# Altium integrated library Weidmueller_OMNIMATE_Power.IntLib: 508 symbols (part 5 of 9)
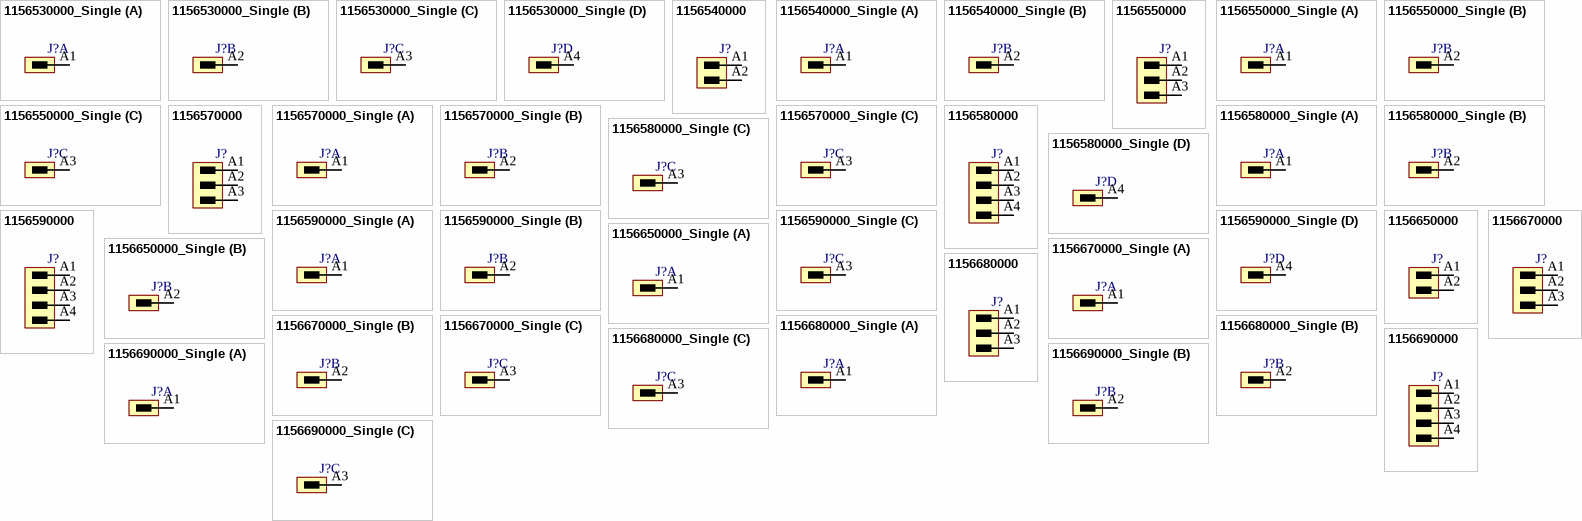
[diagram p35: symbols 1156530000_Single to 1156690000_Single]

## 1156650000_Single
designator J?
OMNIMATE Power - series BU/SU 10.16IT; PartNumber: 1156650000; Manufacturer: Weidmueller; Short_text_for_material: SU 10.16IT/02/90MF2 3.5AG BK BX SO; Side_termination_characteristic: closed side; Note: Middle flange; Mounting_onto_the_PCB: Solder connection; Pitch_mm: 10.16 mm; Pitch_inch: 0.4 inch; No_of_poles: 2; Outgoing_elbow: 90°; Solder_pin_length_mm: 3.5 mm; Contact_material: Cu-Leg; Contact_surface: silver-plated; Insulating_material: PA GF; UL_94_flammability_rating: V-0; Rated_voltage_for_surge_voltage_class_pollution_degree_II_2: 1000 V; Rated_voltage_use_group_B_UL_1059: 300 V; Rated_current_use_group_B_UL_1059: 54 A; PackageReference: SU_10_16IT_90MF2_02; Colour: Black; Packaging: Box; Qty: 60 PCS; Revision: V1; ComponentLink1Description: Manufacturer URL; ComponentLink1URL: http://www.weidmueller.com/; ComponentLink2Description: URL Link1; ComponentLink2URL: http://catalog.weidmueller.com/catalog/Start.do?localeId=en&ObjectID=1156650000
footprint SU_10_16IT_90MF2_02 (OMNIMATE Power - Serie BU/SU 10.16IT  SU 10.16IT/02/90MF2 3.5)
part A pins: A1
part B pins: A2

## 1156670000
designator J?
OMNIMATE Power - series BU/SU 10.16IT; PartNumber: 1156670000; Manufacturer: Weidmueller; Short_text_for_material: SU 10.16IT/03/90MF2 3.5AG BK BX; Side_termination_characteristic: closed side; Note: Middle flange; Mounting_onto_the_PCB: Solder connection; Pitch_mm: 10.16 mm; Pitch_inch: 0.4 inch; No_of_poles: 3; Outgoing_elbow: 90°; Solder_pin_length_mm: 3.5 mm; Contact_material: Cu-Leg; Contact_surface: silver-plated; Insulating_material: PA GF; UL_94_flammability_rating: V-0; Rated_voltage_for_surge_voltage_class_pollution_degree_II_2: 1000 V; Rated_voltage_use_group_B_UL_1059: 300 V; Rated_current_use_group_B_UL_1059: 54 A; PackageReference: SU_10_16IT_90MF2_03; Colour: Black; Packaging: Box; Qty: 42 PCS; Revision: V1; ComponentLink1Description: Manufacturer URL; ComponentLink1URL: http://www.weidmueller.com/; ComponentLink2Description: URL Link1; ComponentLink2URL: http://catalog.weidmueller.com/catalog/Start.do?localeId=en&ObjectID=1156670000
footprint SU_10_16IT_90MF2_03 (OMNIMATE Power - Serie BU/SU 10.16IT  SU 10.16IT/02/90MF3 3.5)
pins: A1, A2, A3

## 1156670000_Single
designator J?
OMNIMATE Power - series BU/SU 10.16IT; PartNumber: 1156670000; Manufacturer: Weidmueller; Short_text_for_material: SU 10.16IT/03/90MF2 3.5AG BK BX; Side_termination_characteristic: closed side; Note: Middle flange; Mounting_onto_the_PCB: Solder connection; Pitch_mm: 10.16 mm; Pitch_inch: 0.4 inch; No_of_poles: 3; Outgoing_elbow: 90°; Solder_pin_length_mm: 3.5 mm; Contact_material: Cu-Leg; Contact_surface: silver-plated; Insulating_material: PA GF; UL_94_flammability_rating: V-0; Rated_voltage_for_surge_voltage_class_pollution_degree_II_2: 1000 V; Rated_voltage_use_group_B_UL_1059: 300 V; Rated_current_use_group_B_UL_1059: 54 A; PackageReference: SU_10_16IT_90MF2_03; Colour: Black; Packaging: Box; Qty: 42 PCS; Revision: V1; ComponentLink1Description: Manufacturer URL; ComponentLink1URL: http://www.weidmueller.com/; ComponentLink2Description: URL Link1; ComponentLink2URL: http://catalog.weidmueller.com/catalog/Start.do?localeId=en&ObjectID=1156670000
footprint SU_10_16IT_90MF2_03 (OMNIMATE Power - Serie BU/SU 10.16IT  SU 10.16IT/02/90MF3 3.5)
part A pins: A1
part B pins: A2
part C pins: A3

## 1156680000
designator J?
OMNIMATE Power - series BU/SU 10.16IT; PartNumber: 1156680000; Manufacturer: Weidmueller; Short_text_for_material: SU 10.16IT/03/90MF3 3.5AG BK BX; Side_termination_characteristic: closed side; Note: Middle flange; Mounting_onto_the_PCB: Solder connection; Pitch_mm: 10.16 mm; Pitch_inch: 0.4 inch; No_of_poles: 3; Outgoing_elbow: 90°; Solder_pin_length_mm: 3.5 mm; Contact_material: Cu-Leg; Contact_surface: silver-plated; Insulating_material: PA GF; UL_94_flammability_rating: V-0; Rated_voltage_for_surge_voltage_class_pollution_degree_II_2: 1000 V; Rated_voltage_use_group_B_UL_1059: 300 V; Rated_current_use_group_B_UL_1059: 54 A; PackageReference: SU_10_16IT_90MF3_03; Colour: Black; Packaging: Box; Qty: 42 PCS; Revision: V1; ComponentLink1Description: Manufacturer URL; ComponentLink1URL: http://www.weidmueller.com/; ComponentLink2Description: URL Link1; ComponentLink2URL: http://catalog.weidmueller.com/catalog/Start.do?localeId=en&ObjectID=1156680000
footprint SU_10_16IT_90MF3_03 (OMNIMATE Power - Serie BU/SU 10.16IT  SU 10.16IT/04/90MF4 3.5)
pins: A1, A2, A3

## 1156680000_Single
designator J?
OMNIMATE Power - series BU/SU 10.16IT; PartNumber: 1156680000; Manufacturer: Weidmueller; Short_text_for_material: SU 10.16IT/03/90MF3 3.5AG BK BX; Side_termination_characteristic: closed side; Note: Middle flange; Mounting_onto_the_PCB: Solder connection; Pitch_mm: 10.16 mm; Pitch_inch: 0.4 inch; No_of_poles: 3; Outgoing_elbow: 90°; Solder_pin_length_mm: 3.5 mm; Contact_material: Cu-Leg; Contact_surface: silver-plated; Insulating_material: PA GF; UL_94_flammability_rating: V-0; Rated_voltage_for_surge_voltage_class_pollution_degree_II_2: 1000 V; Rated_voltage_use_group_B_UL_1059: 300 V; Rated_current_use_group_B_UL_1059: 54 A; PackageReference: SU_10_16IT_90MF3_03; Colour: Black; Packaging: Box; Qty: 42 PCS; Revision: V1; ComponentLink1Description: Manufacturer URL; ComponentLink1URL: http://www.weidmueller.com/; ComponentLink2Description: URL Link1; ComponentLink2URL: http://catalog.weidmueller.com/catalog/Start.do?localeId=en&ObjectID=1156680000
footprint SU_10_16IT_90MF3_03 (OMNIMATE Power - Serie BU/SU 10.16IT  SU 10.16IT/04/90MF4 3.5)
part A pins: A1
part B pins: A2
part C pins: A3

## 1156690000
designator J?
OMNIMATE Power - series BU/SU 10.16IT; PartNumber: 1156690000; Manufacturer: Weidmueller; Short_text_for_material: SU 10.16IT/04/90MF2 3.5AG BK BX; Side_termination_characteristic: closed side; Note: Middle flange; Mounting_onto_the_PCB: Solder connection; Pitch_mm: 10.16 mm; Pitch_inch: 0.4 inch; No_of_poles: 4; Outgoing_elbow: 90°; Solder_pin_length_mm: 3.5 mm; Contact_material: Cu-Leg; Contact_surface: silver-plated; Insulating_material: PA GF; UL_94_flammability_rating: V-0; Rated_voltage_for_surge_voltage_class_pollution_degree_II_2: 1000 V; Rated_voltage_use_group_B_UL_1059: 300 V; Rated_current_use_group_B_UL_1059: 54 A; PackageReference: SU_10_16IT_90MF2_04; Colour: Black; Packaging: Box; Qty: 36 PCS; Revision: V1; ComponentLink1Description: Manufacturer URL; ComponentLink1URL: http://www.weidmueller.com/; ComponentLink2Description: URL Link1; ComponentLink2URL: http://catalog.weidmueller.com/catalog/Start.do?localeId=en&ObjectID=1156690000
footprint SU_10_16IT_90MF2_04 (OMNIMATE Power - Serie BU/SU 10.16IT  SU 10.16IT/04/90MF4 3.5)
pins: A1, A2, A3, A4

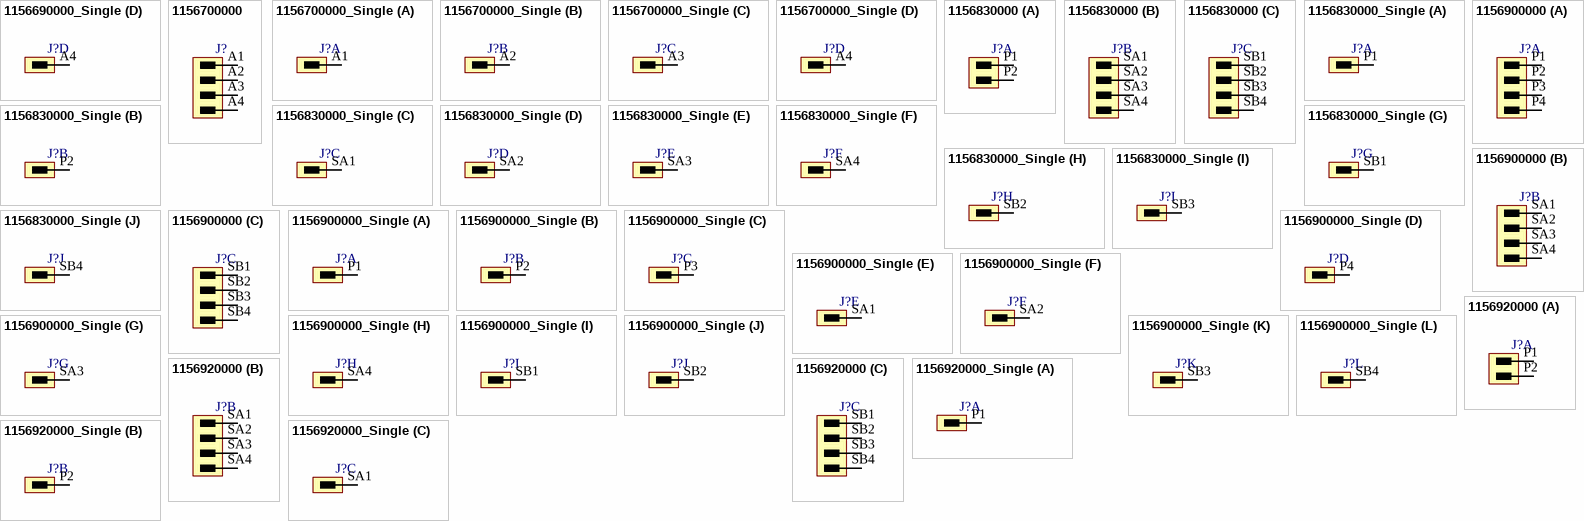
[diagram p15: symbols 1156690000_Single to 1156920000_Single]

## 1156690000_Single
designator J?
OMNIMATE Power - series BU/SU 10.16IT; PartNumber: 1156690000; Manufacturer: Weidmueller; Short_text_for_material: SU 10.16IT/04/90MF2 3.5AG BK BX; Side_termination_characteristic: closed side; Note: Middle flange; Mounting_onto_the_PCB: Solder connection; Pitch_mm: 10.16 mm; Pitch_inch: 0.4 inch; No_of_poles: 4; Outgoing_elbow: 90°; Solder_pin_length_mm: 3.5 mm; Contact_material: Cu-Leg; Contact_surface: silver-plated; Insulating_material: PA GF; UL_94_flammability_rating: V-0; Rated_voltage_for_surge_voltage_class_pollution_degree_II_2: 1000 V; Rated_voltage_use_group_B_UL_1059: 300 V; Rated_current_use_group_B_UL_1059: 54 A; PackageReference: SU_10_16IT_90MF2_04; Colour: Black; Packaging: Box; Qty: 36 PCS; Revision: V1; ComponentLink1Description: Manufacturer URL; ComponentLink1URL: http://www.weidmueller.com/; ComponentLink2Description: URL Link1; ComponentLink2URL: http://catalog.weidmueller.com/catalog/Start.do?localeId=en&ObjectID=1156690000
footprint SU_10_16IT_90MF2_04 (OMNIMATE Power - Serie BU/SU 10.16IT  SU 10.16IT/04/90MF4 3.5)
part A pins: A1
part B pins: A2
part C pins: A3
part D pins: A4

## 1156700000
designator J?
OMNIMATE Power - series BU/SU 10.16IT; PartNumber: 1156700000; Manufacturer: Weidmueller; Short_text_for_material: SU 10.16IT/04/90MF4 3.5AG BK BX; Side_termination_characteristic: closed side; Note: Middle flange; Mounting_onto_the_PCB: Solder connection; Pitch_mm: 10.16 mm; Pitch_inch: 0.4 inch; No_of_poles: 4; Outgoing_elbow: 90°; Solder_pin_length_mm: 3.5 mm; Contact_material: Cu-Leg; Contact_surface: silver-plated; Insulating_material: PA GF; UL_94_flammability_rating: V-0; Rated_voltage_for_surge_voltage_class_pollution_degree_II_2: 1000 V; Rated_voltage_use_group_B_UL_1059: 300 V; Rated_current_use_group_B_UL_1059: 54 A; PackageReference: SU_10_16IT_90MF4_04; Colour: Black; Packaging: Box; Qty: 36 PCS; Revision: V1; ComponentLink1Description: Manufacturer URL; ComponentLink1URL: http://www.weidmueller.com/; ComponentLink2Description: URL Link1; ComponentLink2URL: http://catalog.weidmueller.com/catalog/Start.do?localeId=en&ObjectID=1156700000
footprint SU_10_16IT_90MF4_04 (OMNIMATE Power - Serie BU/SU 10.16IT  SU 10.16IT/04/90MF4 3.5)
pins: A1, A2, A3, A4

## 1156700000_Single
designator J?
OMNIMATE Power - series BU/SU 10.16IT; PartNumber: 1156700000; Manufacturer: Weidmueller; Short_text_for_material: SU 10.16IT/04/90MF4 3.5AG BK BX; Side_termination_characteristic: closed side; Note: Middle flange; Mounting_onto_the_PCB: Solder connection; Pitch_mm: 10.16 mm; Pitch_inch: 0.4 inch; No_of_poles: 4; Outgoing_elbow: 90°; Solder_pin_length_mm: 3.5 mm; Contact_material: Cu-Leg; Contact_surface: silver-plated; Insulating_material: PA GF; UL_94_flammability_rating: V-0; Rated_voltage_for_surge_voltage_class_pollution_degree_II_2: 1000 V; Rated_voltage_use_group_B_UL_1059: 300 V; Rated_current_use_group_B_UL_1059: 54 A; PackageReference: SU_10_16IT_90MF4_04; Colour: Black; Packaging: Box; Qty: 36 PCS; Revision: V1; ComponentLink1Description: Manufacturer URL; ComponentLink1URL: http://www.weidmueller.com/; ComponentLink2Description: URL Link1; ComponentLink2URL: http://catalog.weidmueller.com/catalog/Start.do?localeId=en&ObjectID=1156700000
footprint SU_10_16IT_90MF4_04 (OMNIMATE Power - Serie BU/SU 10.16IT  SU 10.16IT/04/90MF4 3.5)
part A pins: A1
part B pins: A2
part C pins: A3
part D pins: A4

## 1156830000
designator J?
OMNIMATE Power - series BV/SV 7.62HP; PartNumber: 1156830000; Manufacturer: Weidmueller; Short_text_for_material: SV 7.62HP/02/90MSF2 SC/08R SN BK BX; Side_termination_characteristic: closed side; Note: Middle screw flange; Mounting_onto_the_PCB: Solder connection; Pitch_mm: 7.62 mm; Pitch_inch: 0.3 inch; No_of_poles: 2; Outgoing_elbow: 90°; Solder_pin_length_mm: 3.5 mm; Contact_material: Cu-Leg; Contact_surface: tinned; Insulating_material: PA GF; UL_94_flammability_rating: V-0; Rated_voltage_for_surge_voltage_class_pollution_degree_II_2: 1000 V; Rated_voltage_use_group_B_UL_1059: 300 V; Rated_current_use_group_B_UL_1059: 35 A; PackageReference: SV_7_62HP_02_SC_3_81_90MSF2_08; Colour: Black; Packaging: Box; Qty: 48 PCS; Revision: V1; ComponentLink1Description: Manufacturer URL; ComponentLink1URL: http://www.weidmueller.com/; ComponentLink2Description: URL Link1; ComponentLink2URL: http://catalog.weidmueller.com/catalog/Start.do?localeId=en&ObjectID=1156830000
footprint SV_7_62HP_02_SC_3_81_90MSF2_08 (OMNIMATE Power - Serie BV/SV 7.62HP  SV 7.62HP/02/90MSF4 SC/08R)
part A pins: P1, P2
part B pins: SA1, SA2, SA3, SA4
part C pins: SB1, SB2, SB3, SB4

## 1156830000_Single
designator J?
OMNIMATE Power - series BV/SV 7.62HP; PartNumber: 1156830000; Manufacturer: Weidmueller; Short_text_for_material: SV 7.62HP/02/90MSF2 SC/08R SN BK BX; Side_termination_characteristic: closed side; Note: Middle screw flange; Mounting_onto_the_PCB: Solder connection; Pitch_mm: 7.62 mm; Pitch_inch: 0.3 inch; No_of_poles: 2; Outgoing_elbow: 90°; Solder_pin_length_mm: 3.5 mm; Contact_material: Cu-Leg; Contact_surface: tinned; Insulating_material: PA GF; UL_94_flammability_rating: V-0; Rated_voltage_for_surge_voltage_class_pollution_degree_II_2: 1000 V; Rated_voltage_use_group_B_UL_1059: 300 V; Rated_current_use_group_B_UL_1059: 35 A; PackageReference: SV_7_62HP_02_SC_3_81_90MSF2_08; Colour: Black; Packaging: Box; Qty: 48 PCS; Revision: V1; ComponentLink1Description: Manufacturer URL; ComponentLink1URL: http://www.weidmueller.com/; ComponentLink2Description: URL Link1; ComponentLink2URL: http://catalog.weidmueller.com/catalog/Start.do?localeId=en&ObjectID=1156830000
footprint SV_7_62HP_02_SC_3_81_90MSF2_08 (OMNIMATE Power - Serie BV/SV 7.62HP  SV 7.62HP/02/90MSF4 SC/08R)
part A pins: P1
part B pins: P2
part C pins: SA1
part D pins: SA2
part E pins: SA3
part F pins: SA4
part G pins: SB1
part H pins: SB2
part I pins: SB3
part J pins: SB4

## 1156900000
designator J?
OMNIMATE Power - series BV/SV 7.62HP; PartNumber: 1156900000; Manufacturer: Weidmueller; Short_text_for_material: SV 7.62HP/04/90MSF4 SC/08R SN BK BX; Side_termination_characteristic: closed side; Note: Middle screw flange; Mounting_onto_the_PCB: Solder connection; Pitch_mm: 7.62 mm; Pitch_inch: 0.3 inch; No_of_poles: 4; Outgoing_elbow: 90°; Solder_pin_length_mm: 3.5 mm; Contact_material: Cu-Leg; Contact_surface: tinned; Insulating_material: PA GF; UL_94_flammability_rating: V-0; Rated_voltage_for_surge_voltage_class_pollution_degree_II_2: 1000 V; Rated_voltage_use_group_B_UL_1059: 300 V; Rated_current_use_group_B_UL_1059: 35 A; PackageReference: SV_7_62HP_04_SC_3_81_90MSF4_08; Colour: Black; Packaging: Box; Qty: 30 PCS; Revision: V1; ComponentLink1Description: Manufacturer URL; ComponentLink1URL: http://www.weidmueller.com/; ComponentLink2Description: URL Link1; ComponentLink2URL: http://catalog.weidmueller.com/catalog/Start.do?localeId=en&ObjectID=1156900000
footprint SV_7_62HP_04_SC_3_81_90MSF4_08 (OMNIMATE Power - Serie BV/SV 7.62HP  SV 7.62HP/04/90MSF4 SC/08R)
part A pins: P1, P2, P3, P4
part B pins: SA1, SA2, SA3, SA4
part C pins: SB1, SB2, SB3, SB4

## 1156900000_Single
designator J?
OMNIMATE Power - series BV/SV 7.62HP; PartNumber: 1156900000; Manufacturer: Weidmueller; Short_text_for_material: SV 7.62HP/04/90MSF4 SC/08R SN BK BX; Side_termination_characteristic: closed side; Note: Middle screw flange; Mounting_onto_the_PCB: Solder connection; Pitch_mm: 7.62 mm; Pitch_inch: 0.3 inch; No_of_poles: 4; Outgoing_elbow: 90°; Solder_pin_length_mm: 3.5 mm; Contact_material: Cu-Leg; Contact_surface: tinned; Insulating_material: PA GF; UL_94_flammability_rating: V-0; Rated_voltage_for_surge_voltage_class_pollution_degree_II_2: 1000 V; Rated_voltage_use_group_B_UL_1059: 300 V; Rated_current_use_group_B_UL_1059: 35 A; PackageReference: SV_7_62HP_04_SC_3_81_90MSF4_08; Colour: Black; Packaging: Box; Qty: 30 PCS; Revision: V1; ComponentLink1Description: Manufacturer URL; ComponentLink1URL: http://www.weidmueller.com/; ComponentLink2Description: URL Link1; ComponentLink2URL: http://catalog.weidmueller.com/catalog/Start.do?localeId=en&ObjectID=1156900000
footprint SV_7_62HP_04_SC_3_81_90MSF4_08 (OMNIMATE Power - Serie BV/SV 7.62HP  SV 7.62HP/04/90MSF4 SC/08R)
part A pins: P1
part B pins: P2
part C pins: P3
part D pins: P4
part E pins: SA1
part F pins: SA2
part G pins: SA3
part H pins: SA4
part I pins: SB1
part J pins: SB2
part K pins: SB3
part L pins: SB4

## 1156920000
designator J?
OMNIMATE Power - series BV/SV 7.62HP; PartNumber: 1156920000; Manufacturer: Weidmueller; Short_text_for_material: SV 7.62HP/02/270G SC/08R SN BK BX; Side_termination_characteristic: closed side; Mounting_onto_the_PCB: Solder connection; Pitch_mm: 7.62 mm; Pitch_inch: 0.3 inch; No_of_poles: 2; Outgoing_elbow: 270°; Solder_pin_length_mm: 3.5 mm; Contact_material: Cu-Leg; Contact_surface: tinned; Insulating_material: PA GF; UL_94_flammability_rating: V-0; Rated_voltage_for_surge_voltage_class_pollution_degree_II_2: 1000 V; Rated_voltage_use_group_B_UL_1059: 300 V; Rated_current_use_group_B_UL_1059: 35 A; PackageReference: SV_7_62HP_02_SC_3_81_270_08; Colour: Black; Packaging: Box; Qty: 60 PCS; Revision: V1; ComponentLink1Description: Manufacturer URL; ComponentLink1URL: http://www.weidmueller.com/; ComponentLink2Description: URL Link1; ComponentLink2URL: http://catalog.weidmueller.com/catalog/Start.do?localeId=en&ObjectID=1156920000
footprint SV_7_62HP_02_SC_3_81_270_08 (OMNIMATE Power - Serie BV/SV 7.62HP  SV 7.62HP/02/270G SC/08R)
part A pins: P1, P2
part B pins: SA1, SA2, SA3, SA4
part C pins: SB1, SB2, SB3, SB4

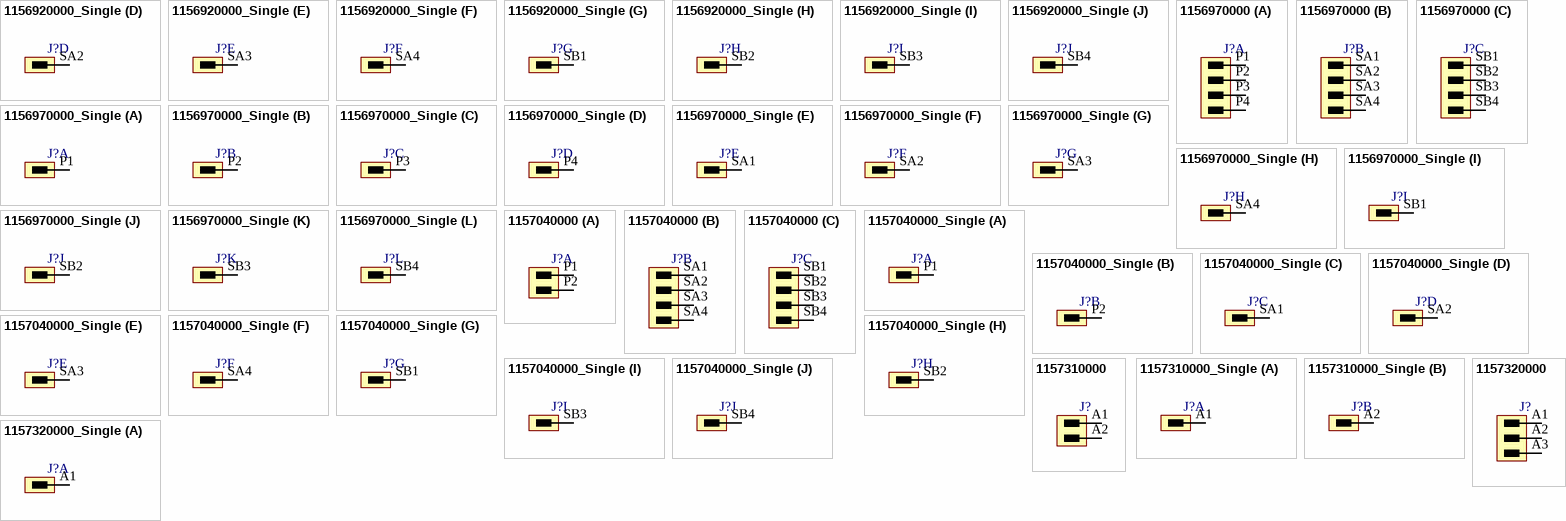
[diagram p16: symbols 1156920000_Single to 1157320000_Single]

## 1156920000_Single
designator J?
OMNIMATE Power - series BV/SV 7.62HP; PartNumber: 1156920000; Manufacturer: Weidmueller; Short_text_for_material: SV 7.62HP/02/270G SC/08R SN BK BX; Side_termination_characteristic: closed side; Mounting_onto_the_PCB: Solder connection; Pitch_mm: 7.62 mm; Pitch_inch: 0.3 inch; No_of_poles: 2; Outgoing_elbow: 270°; Solder_pin_length_mm: 3.5 mm; Contact_material: Cu-Leg; Contact_surface: tinned; Insulating_material: PA GF; UL_94_flammability_rating: V-0; Rated_voltage_for_surge_voltage_class_pollution_degree_II_2: 1000 V; Rated_voltage_use_group_B_UL_1059: 300 V; Rated_current_use_group_B_UL_1059: 35 A; PackageReference: SV_7_62HP_02_SC_3_81_270_08; Colour: Black; Packaging: Box; Qty: 60 PCS; Revision: V1; ComponentLink1Description: Manufacturer URL; ComponentLink1URL: http://www.weidmueller.com/; ComponentLink2Description: URL Link1; ComponentLink2URL: http://catalog.weidmueller.com/catalog/Start.do?localeId=en&ObjectID=1156920000
footprint SV_7_62HP_02_SC_3_81_270_08 (OMNIMATE Power - Serie BV/SV 7.62HP  SV 7.62HP/02/270G SC/08R)
part A pins: P1
part B pins: P2
part C pins: SA1
part D pins: SA2
part E pins: SA3
part F pins: SA4
part G pins: SB1
part H pins: SB2
part I pins: SB3
part J pins: SB4

## 1156970000
designator J?
OMNIMATE Power - series BV/SV 7.62HP; PartNumber: 1156970000; Manufacturer: Weidmueller; Short_text_for_material: SV 7.62HP/04/270G SC/08R SN BK BX; Side_termination_characteristic: closed side; Mounting_onto_the_PCB: Solder connection; Pitch_mm: 7.62 mm; Pitch_inch: 0.3 inch; No_of_poles: 4; Outgoing_elbow: 270°; Solder_pin_length_mm: 3.5 mm; Contact_material: Cu-Leg; Contact_surface: tinned; Insulating_material: PA GF; UL_94_flammability_rating: V-0; Rated_voltage_for_surge_voltage_class_pollution_degree_II_2: 1000 V; Rated_voltage_use_group_B_UL_1059: 300 V; Rated_current_use_group_B_UL_1059: 35 A; PackageReference: SV_7_62HP_04_SC_3_81_270_08; Colour: Black; Packaging: Box; Qty: 42 PCS; Revision: V1; ComponentLink1Description: Manufacturer URL; ComponentLink1URL: http://www.weidmueller.com/; ComponentLink2Description: URL Link1; ComponentLink2URL: http://catalog.weidmueller.com/catalog/Start.do?localeId=en&ObjectID=1156970000
footprint SV_7_62HP_04_SC_3_81_270_08 (OMNIMATE Power - Serie BV/SV 7.62HP  SV 7.62HP/04/270G SC/08R)
part A pins: P1, P2, P3, P4
part B pins: SA1, SA2, SA3, SA4
part C pins: SB1, SB2, SB3, SB4

## 1156970000_Single
designator J?
OMNIMATE Power - series BV/SV 7.62HP; PartNumber: 1156970000; Manufacturer: Weidmueller; Short_text_for_material: SV 7.62HP/04/270G SC/08R SN BK BX; Side_termination_characteristic: closed side; Mounting_onto_the_PCB: Solder connection; Pitch_mm: 7.62 mm; Pitch_inch: 0.3 inch; No_of_poles: 4; Outgoing_elbow: 270°; Solder_pin_length_mm: 3.5 mm; Contact_material: Cu-Leg; Contact_surface: tinned; Insulating_material: PA GF; UL_94_flammability_rating: V-0; Rated_voltage_for_surge_voltage_class_pollution_degree_II_2: 1000 V; Rated_voltage_use_group_B_UL_1059: 300 V; Rated_current_use_group_B_UL_1059: 35 A; PackageReference: SV_7_62HP_04_SC_3_81_270_08; Colour: Black; Packaging: Box; Qty: 42 PCS; Revision: V1; ComponentLink1Description: Manufacturer URL; ComponentLink1URL: http://www.weidmueller.com/; ComponentLink2Description: URL Link1; ComponentLink2URL: http://catalog.weidmueller.com/catalog/Start.do?localeId=en&ObjectID=1156970000
footprint SV_7_62HP_04_SC_3_81_270_08 (OMNIMATE Power - Serie BV/SV 7.62HP  SV 7.62HP/04/270G SC/08R)
part A pins: P1
part B pins: P2
part C pins: P3
part D pins: P4
part E pins: SA1
part F pins: SA2
part G pins: SA3
part H pins: SA4
part I pins: SB1
part J pins: SB2
part K pins: SB3
part L pins: SB4

## 1157040000
designator J?
OMNIMATE Power - series BV/SV 7.62HP; PartNumber: 1157040000; Manufacturer: Weidmueller; Short_text_for_material: SV 7.62HP/02/90G SC/08R SN BK BX; Side_termination_characteristic: closed side; Mounting_onto_the_PCB: Solder connection; Pitch_mm: 7.62 mm; Pitch_inch: 0.3 inch; No_of_poles: 2; Outgoing_elbow: 90°; Solder_pin_length_mm: 3.5 mm; Contact_material: Cu-Leg; Contact_surface: tinned; Insulating_material: PA GF; UL_94_flammability_rating: V-0; Rated_voltage_for_surge_voltage_class_pollution_degree_II_2: 1000 V; Rated_voltage_use_group_B_UL_1059: 300 V; Rated_current_use_group_B_UL_1059: 35 A; PackageReference: SV_7_62HP_02_SC_3_81_90_08; Colour: Black; Packaging: Box; Qty: 60 PCS; Revision: V1; ComponentLink1Description: Manufacturer URL; ComponentLink1URL: http://www.weidmueller.com/; ComponentLink2Description: URL Link1; ComponentLink2URL: http://catalog.weidmueller.com/catalog/Start.do?localeId=en&ObjectID=1157040000
footprint SV_7_62HP_02_SC_3_81_90_08 (OMNIMATE Power - Serie BV/SV 7.62HP  SV 7.62HP/02/90G SC/08R)
part A pins: P1, P2
part B pins: SA1, SA2, SA3, SA4
part C pins: SB1, SB2, SB3, SB4

## 1157040000_Single
designator J?
OMNIMATE Power - series BV/SV 7.62HP; PartNumber: 1157040000; Manufacturer: Weidmueller; Short_text_for_material: SV 7.62HP/02/90G SC/08R SN BK BX; Side_termination_characteristic: closed side; Mounting_onto_the_PCB: Solder connection; Pitch_mm: 7.62 mm; Pitch_inch: 0.3 inch; No_of_poles: 2; Outgoing_elbow: 90°; Solder_pin_length_mm: 3.5 mm; Contact_material: Cu-Leg; Contact_surface: tinned; Insulating_material: PA GF; UL_94_flammability_rating: V-0; Rated_voltage_for_surge_voltage_class_pollution_degree_II_2: 1000 V; Rated_voltage_use_group_B_UL_1059: 300 V; Rated_current_use_group_B_UL_1059: 35 A; PackageReference: SV_7_62HP_02_SC_3_81_90_08; Colour: Black; Packaging: Box; Qty: 60 PCS; Revision: V1; ComponentLink1Description: Manufacturer URL; ComponentLink1URL: http://www.weidmueller.com/; ComponentLink2Description: URL Link1; ComponentLink2URL: http://catalog.weidmueller.com/catalog/Start.do?localeId=en&ObjectID=1157040000
footprint SV_7_62HP_02_SC_3_81_90_08 (OMNIMATE Power - Serie BV/SV 7.62HP  SV 7.62HP/02/90G SC/08R)
part A pins: P1
part B pins: P2
part C pins: SA1
part D pins: SA2
part E pins: SA3
part F pins: SA4
part G pins: SB1
part H pins: SB2
part I pins: SB3
part J pins: SB4

## 1157310000
designator J?
OMNIMATE Power - series BU/SU 10.16IT; PartNumber: 1157310000; Manufacturer: Weidmueller; Short_text_for_material: SU 10.16IT/02/270MF2 3.5AG BK BX SO; Side_termination_characteristic: closed side; Note: Middle flange; Mounting_onto_the_PCB: Solder connection; Pitch_mm: 10.16 mm; Pitch_inch: 0.4 inch; No_of_poles: 2; Outgoing_elbow: 270°; Solder_pin_length_mm: 3.5 mm; Contact_material: Cu-Leg; Contact_surface: silver-plated; Insulating_material: PA GF; UL_94_flammability_rating: V-0; Rated_voltage_for_surge_voltage_class_pollution_degree_II_2: 1000 V; Rated_voltage_use_group_B_UL_1059: 300 V; Rated_current_use_group_B_UL_1059: 54 A; PackageReference: SU_10_16IT_270MF2_02; Colour: Black; Packaging: Box; Qty: 60 PCS; Revision: V1; ComponentLink1Description: Manufacturer URL; ComponentLink1URL: http://www.weidmueller.com/; ComponentLink2Description: URL Link1; ComponentLink2URL: http://catalog.weidmueller.com/catalog/Start.do?localeId=en&ObjectID=1157310000
footprint SU_10_16IT_270MF2_02 (OMNIMATE Power - Serie BU/SU 10.16IT  SU 10.16IT/02/270MF2 3.5)
pins: A1, A2

## 1157310000_Single
designator J?
OMNIMATE Power - series BU/SU 10.16IT; PartNumber: 1157310000; Manufacturer: Weidmueller; Short_text_for_material: SU 10.16IT/02/270MF2 3.5AG BK BX SO; Side_termination_characteristic: closed side; Note: Middle flange; Mounting_onto_the_PCB: Solder connection; Pitch_mm: 10.16 mm; Pitch_inch: 0.4 inch; No_of_poles: 2; Outgoing_elbow: 270°; Solder_pin_length_mm: 3.5 mm; Contact_material: Cu-Leg; Contact_surface: silver-plated; Insulating_material: PA GF; UL_94_flammability_rating: V-0; Rated_voltage_for_surge_voltage_class_pollution_degree_II_2: 1000 V; Rated_voltage_use_group_B_UL_1059: 300 V; Rated_current_use_group_B_UL_1059: 54 A; PackageReference: SU_10_16IT_270MF2_02; Colour: Black; Packaging: Box; Qty: 60 PCS; Revision: V1; ComponentLink1Description: Manufacturer URL; ComponentLink1URL: http://www.weidmueller.com/; ComponentLink2Description: URL Link1; ComponentLink2URL: http://catalog.weidmueller.com/catalog/Start.do?localeId=en&ObjectID=1157310000
footprint SU_10_16IT_270MF2_02 (OMNIMATE Power - Serie BU/SU 10.16IT  SU 10.16IT/02/270MF2 3.5)
part A pins: A1
part B pins: A2

## 1157320000
designator J?
OMNIMATE Power - series BU/SU 10.16IT; PartNumber: 1157320000; Manufacturer: Weidmueller; Short_text_for_material: SU 10.16IT/03/270MF2 3.5AG BK BX; Side_termination_characteristic: closed side; Note: Middle flange; Mounting_onto_the_PCB: Solder connection; Pitch_mm: 10.16 mm; Pitch_inch: 0.4 inch; No_of_poles: 3; Outgoing_elbow: 270°; Solder_pin_length_mm: 3.5 mm; Contact_material: Cu-Leg; Contact_surface: silver-plated; Insulating_material: PA GF; UL_94_flammability_rating: V-0; Rated_voltage_for_surge_voltage_class_pollution_degree_II_2: 1000 V; Rated_voltage_use_group_B_UL_1059: 300 V; Rated_current_use_group_B_UL_1059: 54 A; PackageReference: SU_10_16IT_270MF2_03; Colour: Black; Packaging: Box; Qty: 42 PCS; Revision: V1; ComponentLink1Description: Manufacturer URL; ComponentLink1URL: http://www.weidmueller.com/; ComponentLink2Description: URL Link1; ComponentLink2URL: http://catalog.weidmueller.com/catalog/Start.do?localeId=en&ObjectID=1157320000
footprint SU_10_16IT_270MF2_03 (OMNIMATE Power - Serie BU/SU 10.16IT  SU 10.16IT/02/270MF3 3.5)
pins: A1, A2, A3

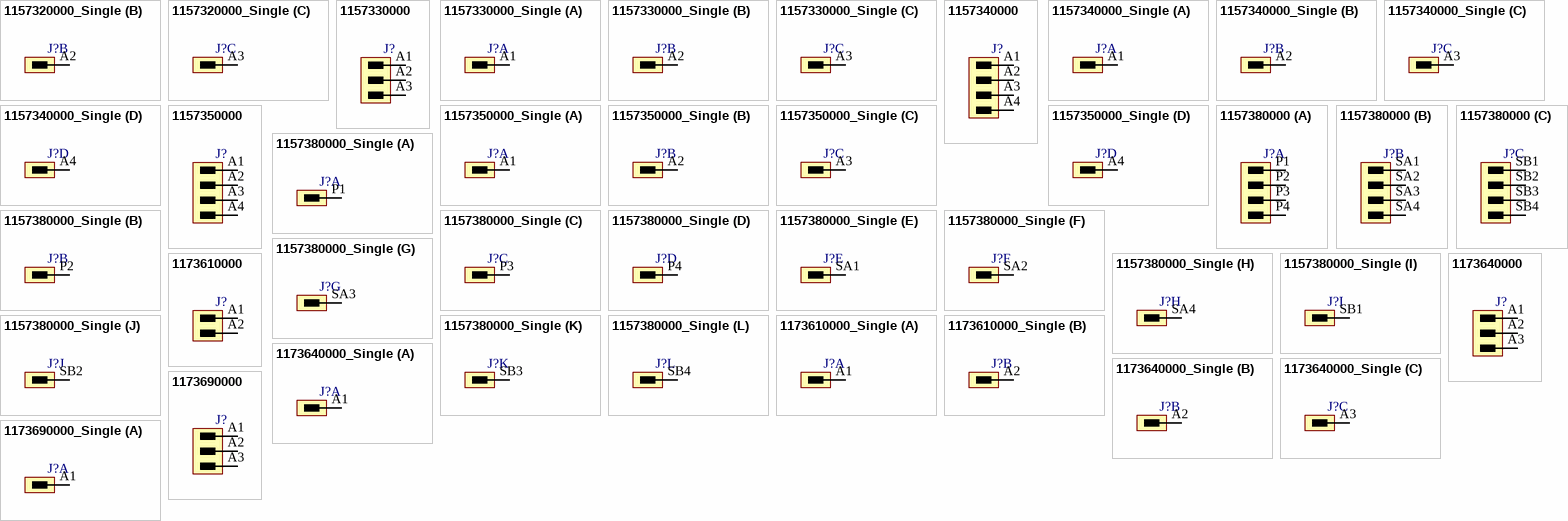
[diagram p17: symbols 1157320000_Single to 1173690000_Single]

## 1157320000_Single
designator J?
OMNIMATE Power - series BU/SU 10.16IT; PartNumber: 1157320000; Manufacturer: Weidmueller; Short_text_for_material: SU 10.16IT/03/270MF2 3.5AG BK BX; Side_termination_characteristic: closed side; Note: Middle flange; Mounting_onto_the_PCB: Solder connection; Pitch_mm: 10.16 mm; Pitch_inch: 0.4 inch; No_of_poles: 3; Outgoing_elbow: 270°; Solder_pin_length_mm: 3.5 mm; Contact_material: Cu-Leg; Contact_surface: silver-plated; Insulating_material: PA GF; UL_94_flammability_rating: V-0; Rated_voltage_for_surge_voltage_class_pollution_degree_II_2: 1000 V; Rated_voltage_use_group_B_UL_1059: 300 V; Rated_current_use_group_B_UL_1059: 54 A; PackageReference: SU_10_16IT_270MF2_03; Colour: Black; Packaging: Box; Qty: 42 PCS; Revision: V1; ComponentLink1Description: Manufacturer URL; ComponentLink1URL: http://www.weidmueller.com/; ComponentLink2Description: URL Link1; ComponentLink2URL: http://catalog.weidmueller.com/catalog/Start.do?localeId=en&ObjectID=1157320000
footprint SU_10_16IT_270MF2_03 (OMNIMATE Power - Serie BU/SU 10.16IT  SU 10.16IT/02/270MF3 3.5)
part A pins: A1
part B pins: A2
part C pins: A3

## 1157330000
designator J?
OMNIMATE Power - series BU/SU 10.16IT; PartNumber: 1157330000; Manufacturer: Weidmueller; Short_text_for_material: SU 10.16IT/03/270MF3 3.5AG BK BX; Side_termination_characteristic: closed side; Note: Middle flange; Mounting_onto_the_PCB: Solder connection; Pitch_mm: 10.16 mm; Pitch_inch: 0.4 inch; No_of_poles: 3; Outgoing_elbow: 270°; Solder_pin_length_mm: 3.5 mm; Contact_material: Cu-Leg; Contact_surface: silver-plated; Insulating_material: PA GF; UL_94_flammability_rating: V-0; Rated_voltage_for_surge_voltage_class_pollution_degree_II_2: 1000 V; Rated_voltage_use_group_B_UL_1059: 300 V; Rated_current_use_group_B_UL_1059: 54 A; PackageReference: SU_10_16IT_270MF3_03; Colour: Black; Packaging: Box; Qty: 42 PCS; Revision: V1; ComponentLink1Description: Manufacturer URL; ComponentLink1URL: http://www.weidmueller.com/; ComponentLink2Description: URL Link1; ComponentLink2URL: http://catalog.weidmueller.com/catalog/Start.do?localeId=en&ObjectID=1157330000
footprint SU_10_16IT_270MF3_03 (OMNIMATE Power - Serie BU/SU 10.16IT  SU 10.16IT/03/270MF3 3.5)
pins: A1, A2, A3

## 1157330000_Single
designator J?
OMNIMATE Power - series BU/SU 10.16IT; PartNumber: 1157330000; Manufacturer: Weidmueller; Short_text_for_material: SU 10.16IT/03/270MF3 3.5AG BK BX; Side_termination_characteristic: closed side; Note: Middle flange; Mounting_onto_the_PCB: Solder connection; Pitch_mm: 10.16 mm; Pitch_inch: 0.4 inch; No_of_poles: 3; Outgoing_elbow: 270°; Solder_pin_length_mm: 3.5 mm; Contact_material: Cu-Leg; Contact_surface: silver-plated; Insulating_material: PA GF; UL_94_flammability_rating: V-0; Rated_voltage_for_surge_voltage_class_pollution_degree_II_2: 1000 V; Rated_voltage_use_group_B_UL_1059: 300 V; Rated_current_use_group_B_UL_1059: 54 A; PackageReference: SU_10_16IT_270MF3_03; Colour: Black; Packaging: Box; Qty: 42 PCS; Revision: V1; ComponentLink1Description: Manufacturer URL; ComponentLink1URL: http://www.weidmueller.com/; ComponentLink2Description: URL Link1; ComponentLink2URL: http://catalog.weidmueller.com/catalog/Start.do?localeId=en&ObjectID=1157330000
footprint SU_10_16IT_270MF3_03 (OMNIMATE Power - Serie BU/SU 10.16IT  SU 10.16IT/03/270MF3 3.5)
part A pins: A1
part B pins: A2
part C pins: A3

## 1157340000
designator J?
OMNIMATE Power - series BU/SU 10.16IT; PartNumber: 1157340000; Manufacturer: Weidmueller; Short_text_for_material: SU 10.16IT/04/270MF2 3.5AG BK BX; Side_termination_characteristic: closed side; Note: Middle flange; Mounting_onto_the_PCB: Solder connection; Pitch_mm: 10.16 mm; Pitch_inch: 0.4 inch; No_of_poles: 4; Outgoing_elbow: 270°; Solder_pin_length_mm: 3.5 mm; Contact_material: Cu-Leg; Contact_surface: silver-plated; Insulating_material: PA GF; UL_94_flammability_rating: V-0; Rated_voltage_for_surge_voltage_class_pollution_degree_II_2: 1000 V; Rated_voltage_use_group_B_UL_1059: 300 V; Rated_current_use_group_B_UL_1059: 54 A; PackageReference: SU_10_16IT_270MF2_04; Colour: Black; Packaging: Box; Qty: 36 PCS; Revision: V1; ComponentLink1Description: Manufacturer URL; ComponentLink1URL: http://www.weidmueller.com/; ComponentLink2Description: URL Link1; ComponentLink2URL: http://catalog.weidmueller.com/catalog/Start.do?localeId=en&ObjectID=1157340000
footprint SU_10_16IT_270MF2_04 (OMNIMATE Power - Serie BU/SU 10.16IT  SU 10.16IT/04/270MF2 3.5)
pins: A1, A2, A3, A4

## 1157340000_Single
designator J?
OMNIMATE Power - series BU/SU 10.16IT; PartNumber: 1157340000; Manufacturer: Weidmueller; Short_text_for_material: SU 10.16IT/04/270MF2 3.5AG BK BX; Side_termination_characteristic: closed side; Note: Middle flange; Mounting_onto_the_PCB: Solder connection; Pitch_mm: 10.16 mm; Pitch_inch: 0.4 inch; No_of_poles: 4; Outgoing_elbow: 270°; Solder_pin_length_mm: 3.5 mm; Contact_material: Cu-Leg; Contact_surface: silver-plated; Insulating_material: PA GF; UL_94_flammability_rating: V-0; Rated_voltage_for_surge_voltage_class_pollution_degree_II_2: 1000 V; Rated_voltage_use_group_B_UL_1059: 300 V; Rated_current_use_group_B_UL_1059: 54 A; PackageReference: SU_10_16IT_270MF2_04; Colour: Black; Packaging: Box; Qty: 36 PCS; Revision: V1; ComponentLink1Description: Manufacturer URL; ComponentLink1URL: http://www.weidmueller.com/; ComponentLink2Description: URL Link1; ComponentLink2URL: http://catalog.weidmueller.com/catalog/Start.do?localeId=en&ObjectID=1157340000
footprint SU_10_16IT_270MF2_04 (OMNIMATE Power - Serie BU/SU 10.16IT  SU 10.16IT/04/270MF2 3.5)
part A pins: A1
part B pins: A2
part C pins: A3
part D pins: A4

## 1157350000
designator J?